# Altium footprint library MyLibrarySum.PcbLib: 208 footprints (part 4 of 13)
Each footprint in its own frame and in the unit in brackets; x right, y up, seen from the top. Pads: shape width x height; smd on the part's side, far side on the other; paste and mask are expansions set on the pad; w line width, h text height; cw(c..) or ccw(c..) is an arc to the next point about the centre after c.
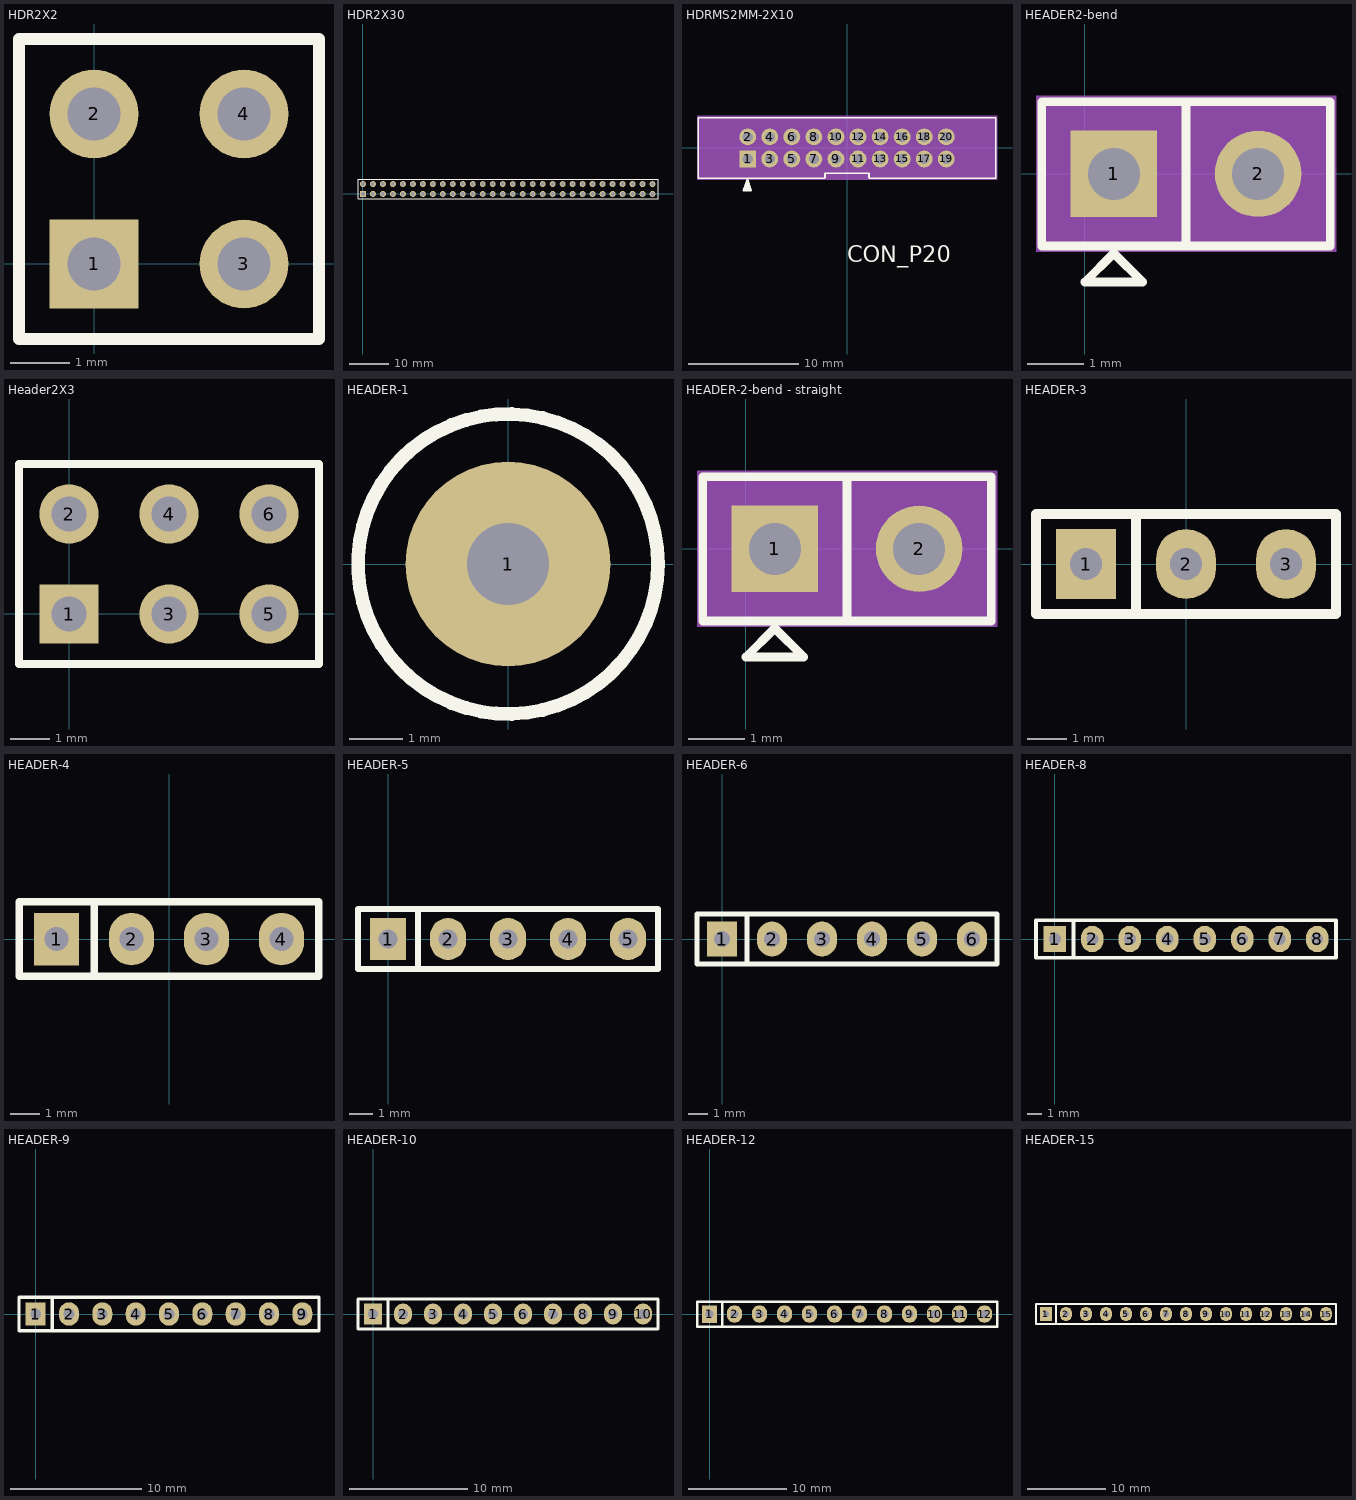
[diagram p3: the footprints below, top view; thin cyan lines are the x and y axes]

## HDR2X2 [mm] "Connec"
pads (4):
  rect 1.5x1.5 hole 0.9: 1(0,0)
  round 1.5 hole 0.9: 2(0,2.54) 3(2.54,0) 4(2.54,2.54)
Top Overlay:
  lines w0.2: -1.27,-1.27 3.81,-1.27 3.81,3.81 -1.27,3.81 -1.27,-1.27
3D body: height 10.1, standoff -1.5, extent -1.143,-1.397 3.937,3.683

## HDR2X30 [mm] "Connector; Header; 30x2 Position"
pads (60):
  rect 1.5x1.5 hole 0.9: 1(0,0)
  round 1.5 hole 0.9: 2(0,2.54) 3(2.54,0) 4(2.54,2.54) 5(5.08,0) 6(5.08,2.54) 7(7.62,0) 8(7.62,2.54) 9(10.16,0) 10(10.16,2.54) 11(12.7,0) 12(12.7,2.54) 13(15.24,0) 14(15.24,2.54) 15(17.78,0) 16(17.78,2.54) 17(20.32,0) 18(20.32,2.54) 19(22.86,0) 20(22.86,2.54) 21(25.4,0) 22(25.4,2.54) 23(27.94,0) 24(27.94,2.54) 25(30.48,0) 26(30.48,2.54) 27(33.02,0) 28(33.02,2.54) 29(35.56,0) 30(35.56,2.54) 31(38.1,0) 32(38.1,2.54) 33(40.64,0) 34(40.64,2.54) 35(43.18,0) 36(43.18,2.54) 37(45.72,0) 38(45.72,2.54) 39(48.26,0) 40(48.26,2.54) 41(50.8,0) 42(50.8,2.54) 43(53.34,0) 44(53.34,2.54) 45(55.88,0) 46(55.88,2.54) 47(58.42,0) 48(58.42,2.54) 49(60.96,0) 50(60.96,2.54) 51(63.5,0) 52(63.5,2.54) 53(66.04,0) 54(66.04,2.54) 55(68.58,0) 56(68.58,2.54) 57(71.12,0) 58(71.12,2.54) 59(73.66,0) 60(73.66,2.54)
Top Overlay:
  lines w0.2: -1.27,-1.27 75.06,-1.27 75.06,3.81 -1.27,3.81 -1.27,-1.27
3D body: height 8.5, standoff -3.3, extent -1.27,-1.27 74.93,3.73

## HDRMS2MM-2X10 [mil] "HDRMS2MM-2X10"
pads (20):
  rect 60x60 hole 36: 1(-354.33,-39.37)
  round 60 hole 36: 2(-354.33,39.37) 3(-275.59,-39.37) 4(-275.59,39.37) 5(-196.85,-39.37) 6(-196.85,39.37) 7(-118.11,-39.37) 8(-118.11,39.37) 9(-39.37,-39.37) 10(-39.37,39.37) 11(39.37,-39.37) 12(39.37,39.37) 13(118.11,-39.37) 14(118.11,39.37) 15(196.85,-39.37) 16(196.85,39.37) 17(275.59,-39.37) 18(275.59,39.37) 19(354.33,-39.37) 20(354.33,39.37)
Top Overlay:
  lines w5.98: -531.5,-108.27 -531.5,108.27 531.5,108.27 531.5,-108.27 80.71,-108.27 78.74,-106.3 78.74,-90.55 -78.74,-90.55 -78.74,-106.3 -80.71,-108.27 -531.5,-108.27
  lines w7.87: -360.75,-151.38 -355.51,-112.01 ; -352.87,-151.38 -355.51,-112.01 ; -345,-151.38 -355.51,-112.01 ; -355.51,-112.01 -342.4,-151.38 -368.62,-151.38 -355.51,-112.01
  text "CON_P20" at 0,-407.28 h59.05
Mechanical 11:
  text "11" at 39.37,-59.37 h25
  text "15" at 196.85,-59.37 h25
  text "2" at -354.33,29.37 h25
  text "1" at -354.33,-49.37 h25
  text "9" at -39.37,-49.37 h25
  text "13" at 118.11,-59.37 h25
  text "3" at -275.59,-49.37 h25
  text "5" at -196.85,-49.37 h25
  text "7" at -118.11,-49.37 h25
  text "20" at 354.33,19.37 h25
  text "18" at 275.59,19.37 h25
  text "16" at 196.85,19.37 h25
  text "14" at 118.11,19.37 h25
  text "12" at 39.37,19.37 h25
  text "10" at -39.37,19.37 h25
  text "8" at -118.11,29.37 h25
  text "6" at -196.85,29.37 h25
  text "4" at -275.59,29.37 h25
  text "19" at 354.33,-59.37 h25
  text "17" at 275.59,-59.37 h25
Mechanical 12:
  text "pn" at -450,-70.47 h15.75
  text "RichardLC" at 0,-64.57 h15.75
  text "CON_P20" at -450,-101.97 h15.75
  text ".Designator" at -450,-89.37 h15.75
Mechanical 13:
  region: 535.43,-114.17 535.43,114.17 -535.43,114.17 -535.43,-114.17

## HEADER2-bend [mil] "A4B-2PA-2_54DSA"
pads (2):
  rect 60x60 hole 36: 1(20,0)
  round 60 hole 36: 2(120,0)
Top Overlay:
  lines w5.98: 0,-75 20,-55 40,-75 0,-75
  lines w6: 70,-50 70,50 ; -30,-50 170,-50 170,50 -30,50 -30,-50
Mechanical 11:
  text "1" at 8.98,0 h27.56
  text "2" at 108.98,0 h27.56
Mechanical 12:
  lines w1: -30,-50 170,-50 170,50 -30,50 -30,-50
Mechanical 13:
  region: 173.94,-53.94 173.94,53.94 -33.94,53.94 -33.94,-53.94
3D body: height 170.28, standoff -118.11, extent -30,-234.19 170,91.4

## Header2X3 [mm]
pads (6):
  rect 1.5x1.5 hole 0.9: 1(0,0)
  round 1.5 hole 0.9: 2(0,2.54) 3(2.54,0) 4(2.54,2.54) 5(5.08,0) 6(5.08,2.54)
Top Overlay:
  lines w0.2: 1.482,-1.27 6.35,-1.27 ; 6.35,-1.27 -1.27,-1.27 -1.27,3.81 6.35,3.81 6.35,-1.27
3D body: height 10.1, standoff -1.5, extent -1.27,-1.27 6.35,3.81

## HEADER-1 [mil]
pads (1):
  round 150 hole 60: 1(0,0)
Top Overlay:
  circle w10: c0,0 r110

## HEADER-2-bend - straight [mil] "A4B-2PA-2_54DSA"
pads (2):
  rect 60x60 hole 36: 1(20,0)
  round 60 hole 36: 2(120,0)
Top Overlay:
  lines w5.98: 0,-75 20,-55 40,-75 0,-75
  lines w6: 70,-50 70,50 ; -30,-50 170,-50 170,50 -30,50 -30,-50
Mechanical 11:
  text "1" at 8.98,0 h27.56
  text "2" at 108.98,0 h27.56
Mechanical 12:
  lines w1: -30,-50 170,-50 170,50 -30,50 -30,-50
Mechanical 13:
  region: 173.94,-53.94 173.94,53.94 -33.94,53.94 -33.94,-53.94
3D body: height 397.64, standoff -59.06, extent -30,-50 170,50

## HEADER-3 [mil]
pads (3):
  rect 60x70 hole 32: 1(-100,0)
  oval 60x70 hole 32: 2(0,0) 3(100,0)
Top Overlay:
  lines w10: -50,-50 -50,50 ; -150,-50 -150,50 150,50 150,-50 -150,-50
3D body: height 397.64, standoff -59.06, extent -150,-50 150,50

## HEADER-4 [mil]
pads (4):
  rect 60x70 hole 32: 1(-150,0)
  oval 60x70 hole 32: 2(-50,0) 3(50,0) 4(150,0)
Top Overlay:
  lines w10: -100,-50 -100,50 ; -200,-50 -200,50 200,50 200,-50 -200,-50
3D body: height 397.64, standoff -59.06, extent -200,-50 200,50

## HEADER-5 [mil]
pads (5):
  rect 60x70 hole 32: 1(0,0)
  oval 60x70 hole 32: 2(100,0) 3(200,0) 4(300,0) 5(400,0)
Top Overlay:
  lines w10: 50,-50 50,50 ; -50,-50 450,-50 450,50 -50,50 -50,-50
3D body: height 397.64, standoff -59.06, extent -50,-45 450,55

## HEADER-6 [mil]
pads (6):
  rect 60x70 hole 32: 1(0,0)
  oval 60x70 hole 32: 2(100,0) 3(200,0) 4(300,0) 5(400,0) 6(500,0)
Top Overlay:
  lines w10: 50,-50 50,50 ; -50,-50 550,-50 550,50 -50,50 -50,-50
3D body: height 397.64, standoff -59.06, extent -50,-50 550,50

## HEADER-8 [mil]
pads (8):
  rect 60x70 hole 32: 1(0,0)
  oval 60x70 hole 32: 2(100,0) 3(200,0) 4(300,0) 5(400,0) 6(500,0) 7(600,0) 8(700,0)
Top Overlay:
  lines w10: 50,-50 50,50 ; -50,-50 750,-50 750,50 -50,50 -50,-50
3D body: height 397.64, standoff -59.06, extent -50,-50 750,50

## HEADER-9 [mil]
pads (9):
  rect 60x70 hole 32: 1(0,0)
  oval 60x70 hole 32: 2(100,0) 3(200,0) 4(300,0) 5(400,0) 6(500,0) 7(600,0) 8(700,0) 9(800,0)
Top Overlay:
  lines w10: 50,-50 50,50 ; -50,-50 -50,50 850,50 850,-50 -50,-50
3D body: height 397.64, standoff -59.06, extent -50,-50 850,50

## HEADER-10 [mil]
pads (10):
  rect 60x70 hole 32: 1(0,0)
  oval 60x70 hole 32: 2(100,0) 3(200,0) 4(300,0) 5(400,0) 6(500,0) 7(600,0) 8(700,0) 9(800,0) 10(900,0)
Top Overlay:
  lines w10: 50,-50 50,50 ; -50,-50 -50,50 950,50 950,-50 -50,-50
3D body: height 397.64, standoff -59.06, extent -50,-50 950,50

## HEADER-12 [mil]
pads (12):
  rect 60x70 hole 32: 1(0,0)
  oval 60x70 hole 32: 2(100,0) 3(200,0) 4(300,0) 5(400,0) 6(500,0) 7(600,0) 8(700,0) 9(800,0) 10(900,0) 11(1000,0) 12(1100,0)
Top Overlay:
  lines w10: 50,-50 50,50 ; -50,-50 1150,-50 1150,50 -50,50 -50,-50
3D body: height 397.64, standoff -59.06, extent -50,-50 1150,50

## HEADER-15 [mil]
pads (15):
  rect 60x70 hole 32: 1(-12185,-1395)
  oval 60x70 hole 32: 2(-12085,-1395) 3(-11985,-1395) 4(-11885,-1395) 5(-11785,-1395) 6(-11685,-1395) 7(-11585,-1395) 8(-11485,-1395) 9(-11385,-1395) 10(-11285,-1395) 11(-11185,-1395) 12(-11085,-1395) 13(-10985,-1395) 14(-10885,-1395) 15(-10785,-1395)
Top Overlay:
  lines w10: -12135,-1445 -12135,-1345 ; -12235,-1445 -12235,-1345 -10735,-1345 -10735,-1445 -12235,-1445
3D body: height 397.64, standoff -59.06, extent -12235,-1445 -10735,-1345